# Altium footprint library ICs And Semiconductors THD.PcbLib: 507 footprints (part 5 of 32)
Each footprint in its own frame and in the unit in brackets; x right, y up, seen from the top. Pads: shape width x height; smd on the part's side, far side on the other; paste and mask are expansions set on the pad; w line width, h text height; cw(c..) or ccw(c..) is an arc to the next point about the centre after c.
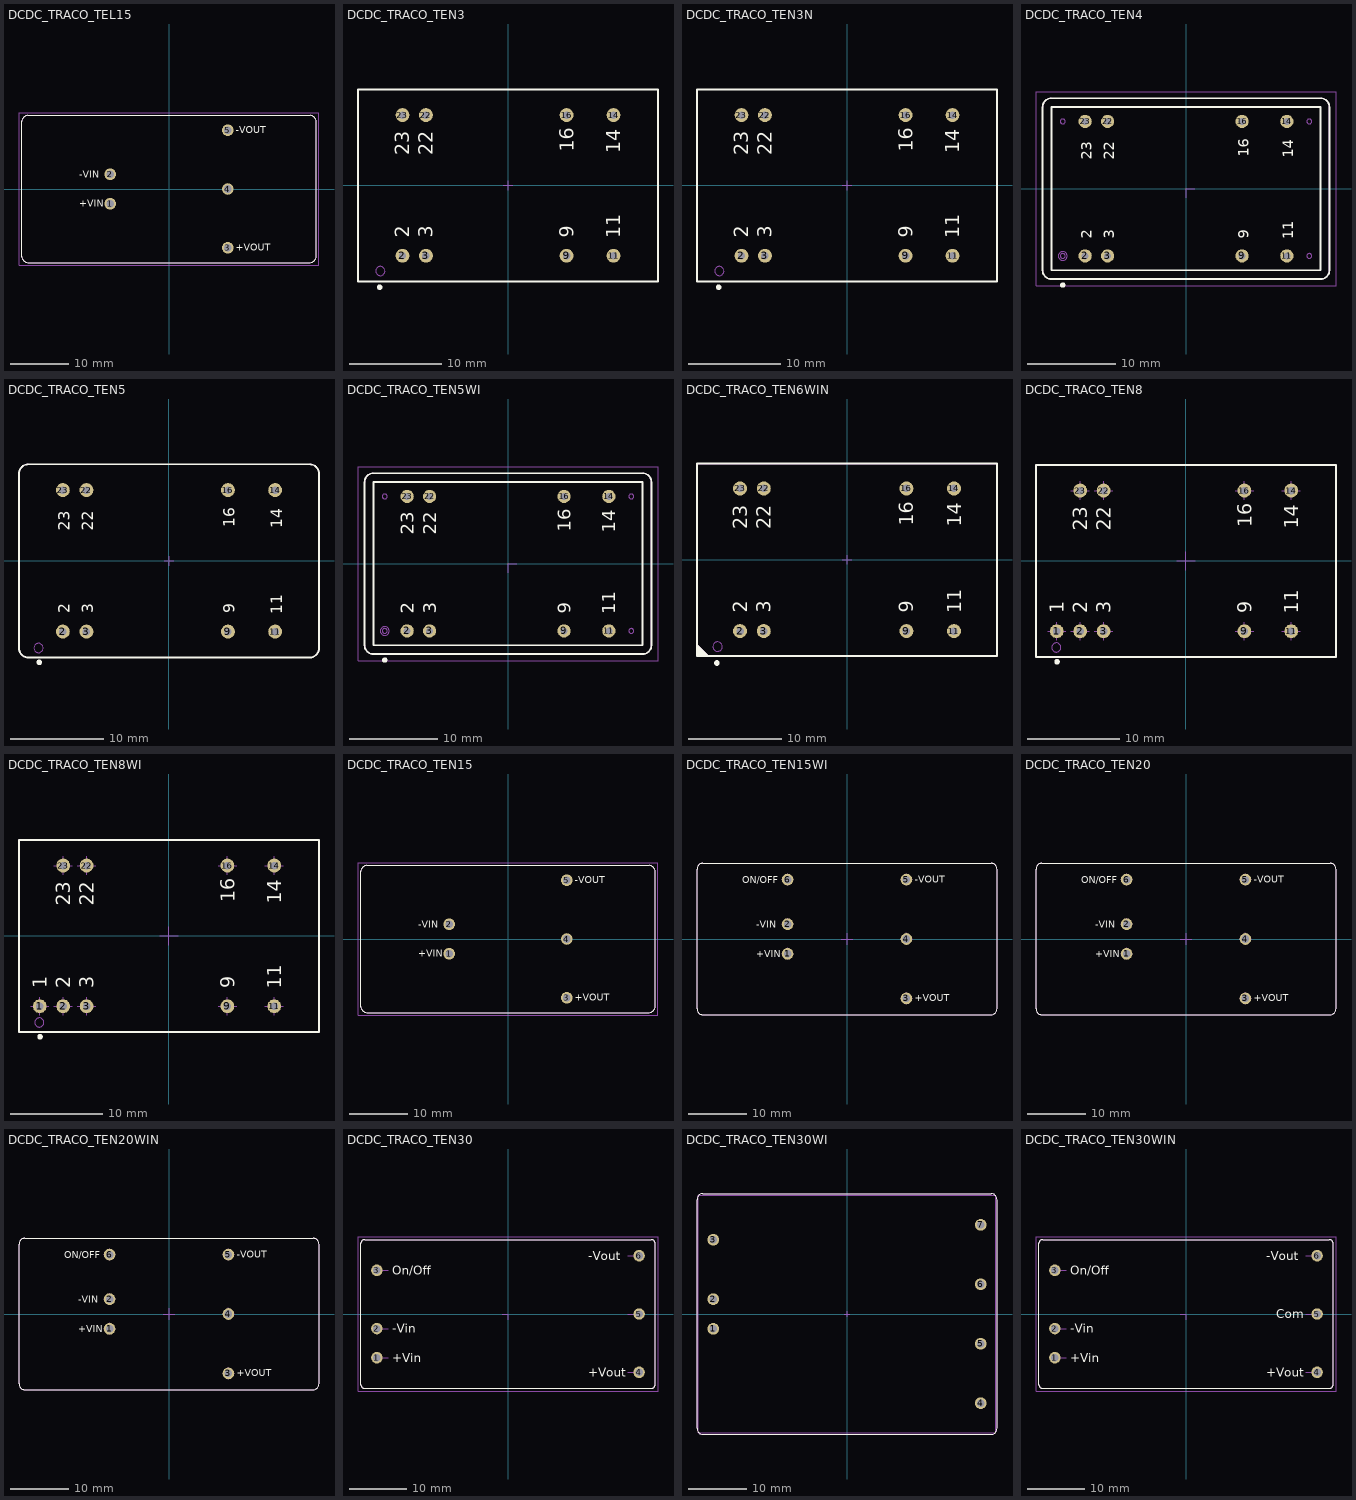
[diagram p4: the footprints below, top view; thin cyan lines are the x and y axes]

## DCDC_TRACO_TEL15 [mm] "TEL 15 Series , Body 50.8x25.4mm, Height 10.7mm"
height 10.7
pads (5):
  round 2 hole 1.3: 1(-10.16,-2.54) 2(-10.16,2.54) 3(10.16,-10.16) 4(10.16,0) 5(10.16,10.16)
Top Overlay:
  lines w0.2: -25.4,-11.7 ccw(c-24.4,-11.7) -24.4,-12.7 24.4,-12.7 ccw(c24.4,-11.7) 25.4,-11.7 25.4,11.7 ccw(c24.4,11.7) 24.4,12.7 -24.4,12.7 ccw(c-24.4,11.7) -25.4,11.7 -25.4,-11.7
  text "-VIN" at -15.5,1.9 h1.2
  text "-VOUT" at 11.56,9.645 h1.2
  text "+VOUT" at 11.56,-10.675 h1.2
  text "+VIN" at -15.5,-3.1 h1.2
Mechanical 14:
  lines w0.1: -25.4,-11.7 ccw(c-24.4,-11.7) -24.4,-12.7 24.4,-12.7 ccw(c24.4,-11.7) 25.4,-11.7 25.4,11.7 ccw(c24.4,11.7) 24.4,12.7 -24.4,12.7 ccw(c-24.4,11.7) -25.4,11.7 -25.4,-11.7
  text "+VOUT" at 11.56,-10.675 h1.2
  text "-VOUT" at 11.56,9.645 h1.2
  text "+VIN" at -15.5,-3.1 h1.2
  text "-VIN" at -15.5,1.9 h1.2
Mechanical 15:
  lines w0.05: -25.9,-13.2 25.9,-13.2 25.9,13.2 -25.9,13.2 -25.9,-13.2
3D body "DCDC_TRACO_TEL15.stp": height 10.2, standoff -3.8, extent -25.4,-12.7 25.4,12.7

## DCDC_TRACO_TEN3 [mm] "TEN 3 Series , Body 32x20.3mm"
height 10.7
pads (8):
  round 1.5 hole 0.8: 2(-11.43,-7.62) 3(-8.89,-7.62) 9(6.35,-7.62) 11(11.43,-7.62) 14(11.43,7.62) 16(6.35,7.62) 22(-8.89,7.62) 23(-11.43,7.62)
Top Overlay:
  circle w0.3: c-13.9,-11.025 r0.15
  lines w0.2: -16.25,-10.4 -16.25,10.4 16.25,10.4 16.25,-10.4 -16.25,-10.4
  text "16" at 7.1,3.632 h1.5
  text "14" at 12.18,3.505 h1.5
  text "22" at -8.14,3.251 h1.5
  text "23" at -10.68,3.251 h1.5
  text "9" at 7.1,-5.663 h1.5
  text "11" at 12.18,-5.737 h1.5
  text "3" at -8.14,-5.663 h1.5
  text "2" at -10.68,-5.663 h1.5
Notvisible:
  lines w0.1: -11.93,-7.62 -11.43,-7.62 ; -11.93,7.62 -11.43,7.62 ; -11.43,-8.12 -11.43,-7.62 ; -11.43,-7.12 -11.43,-7.62 ; -11.43,7.12 -11.43,7.62 ; -11.43,8.12 -11.43,7.62 ; -10.93,-7.62 -11.43,-7.62 ; -10.93,7.62 -11.43,7.62 ; -9.39,-7.62 -8.89,-7.62 ; -9.39,7.62 -8.89,7.62 ; -8.89,-8.12 -8.89,-7.62 ; -8.89,-7.12 -8.89,-7.62 ; -8.89,7.12 -8.89,7.62 ; -8.89,8.12 -8.89,7.62 ; -8.39,-7.62 -8.89,-7.62 ; -8.39,7.62 -8.89,7.62 ; -0.5,0 0,0 ; 0,-0.5 0,0 ; 0,0.5 0,0 ; 0.5,0 0,0 ; 5.85,-7.62 6.35,-7.62 ; 5.85,7.62 6.35,7.62 ; 6.35,-8.12 6.35,-7.62 ; 6.35,-7.12 6.35,-7.62 ; 6.35,7.12 6.35,7.62 ; 6.35,8.12 6.35,7.62 ; 6.85,-7.62 6.35,-7.62 ; 6.85,7.62 6.35,7.62 ; 10.93,-7.62 11.43,-7.62 ; 10.93,7.62 11.43,7.62 ; 11.43,-8.12 11.43,-7.62 ; 11.43,-7.12 11.43,-7.62 ; 11.43,7.12 11.43,7.62 ; 11.43,8.12 11.43,7.62 ; 11.93,-7.62 11.43,-7.62 ; 11.93,7.62 11.43,7.62
Mechanical 14:
  circle w0.1: c-13.825,-9.275 r0.5
  lines w0.1: -16.25,-10.4 -16.25,10.4 16.25,10.4 16.25,-10.4 -16.25,-10.4
  text "2" at -10.68,-5.663 h1.5
  text "3" at -8.14,-5.663 h1.5
  text "11" at 12.18,-5.737 h1.5
  text "9" at 7.1,-5.663 h1.5
  text "23" at -10.68,3.251 h1.5
  text "22" at -8.14,3.251 h1.5
  text "14" at 12.18,3.505 h1.5
  text "16" at 7.1,3.632 h1.5
3D body "DCDC_TRACO_TEN3.stp": height 12.7, standoff -3.8, extent -16.25,-10.4 16.25,10.4

## DCDC_TRACO_TEN3N [mm] "TEN 3N Series, Body 32.3x20.8mm"
height 10.7
pads (8):
  round 1.5 hole 0.8: 2(-11.43,-7.62) 3(-8.89,-7.62) 9(6.35,-7.62) 11(11.43,-7.62) 14(11.43,7.62) 16(6.35,7.62) 22(-8.89,7.62) 23(-11.43,7.62)
Top Overlay:
  circle w0.3: c-13.9,-11.025 r0.15
  lines w0.2: -16.25,-10.4 -16.25,10.4 16.25,10.4 16.25,-10.4 -16.25,-10.4
  text "16" at 7.1,3.632 h1.5
  text "14" at 12.18,3.505 h1.5
  text "22" at -8.14,3.251 h1.5
  text "23" at -10.68,3.251 h1.5
  text "9" at 7.1,-5.663 h1.5
  text "11" at 12.18,-5.737 h1.5
  text "3" at -8.14,-5.663 h1.5
  text "2" at -10.68,-5.663 h1.5
Notvisible:
  lines w0.1: -11.93,-7.62 -11.43,-7.62 ; -11.93,7.62 -11.43,7.62 ; -11.43,-8.12 -11.43,-7.62 ; -11.43,-7.12 -11.43,-7.62 ; -11.43,7.12 -11.43,7.62 ; -11.43,8.12 -11.43,7.62 ; -10.93,-7.62 -11.43,-7.62 ; -10.93,7.62 -11.43,7.62 ; -9.39,-7.62 -8.89,-7.62 ; -9.39,7.62 -8.89,7.62 ; -8.89,-8.12 -8.89,-7.62 ; -8.89,-7.12 -8.89,-7.62 ; -8.89,7.12 -8.89,7.62 ; -8.89,8.12 -8.89,7.62 ; -8.39,-7.62 -8.89,-7.62 ; -8.39,7.62 -8.89,7.62 ; -0.5,0 0,0 ; 0,-0.5 0,0 ; 0,0.5 0,0 ; 0.5,0 0,0 ; 5.85,-7.62 6.35,-7.62 ; 5.85,7.62 6.35,7.62 ; 6.35,-8.12 6.35,-7.62 ; 6.35,-7.12 6.35,-7.62 ; 6.35,7.12 6.35,7.62 ; 6.35,8.12 6.35,7.62 ; 6.85,-7.62 6.35,-7.62 ; 6.85,7.62 6.35,7.62 ; 10.93,-7.62 11.43,-7.62 ; 10.93,7.62 11.43,7.62 ; 11.43,-8.12 11.43,-7.62 ; 11.43,-7.12 11.43,-7.62 ; 11.43,7.12 11.43,7.62 ; 11.43,8.12 11.43,7.62 ; 11.93,-7.62 11.43,-7.62 ; 11.93,7.62 11.43,7.62
Mechanical 14:
  circle w0.1: c-13.825,-9.275 r0.5
  lines w0.1: -16.25,-10.4 -16.25,10.4 16.25,10.4 16.25,-10.4 -16.25,-10.4
  text "2" at -10.68,-5.663 h1.5
  text "3" at -8.14,-5.663 h1.5
  text "11" at 12.18,-5.737 h1.5
  text "9" at 7.1,-5.663 h1.5
  text "23" at -10.68,3.251 h1.5
  text "22" at -8.14,3.251 h1.5
  text "14" at 12.18,3.505 h1.5
  text "16" at 7.1,3.632 h1.5
3D body "DCDC_TRACO_TEN3N.stp": height 12.7, standoff -3.8, extent -16.25,-10.4 16.25,10.4

## DCDC_TRACO_TEN4 [mm] "TEN 4 Series , Body 32.5x20.8mm, DIP-24 Package with Standard Pinout"
height 10.5
pads (8):
  round 1.5 hole 0.8: 2(-11.43,-7.62) 3(-8.89,-7.62) 9(6.35,-7.62) 11(11.43,-7.62) 14(11.43,7.62) 16(6.35,7.62) 22(-8.89,7.62) 23(-11.43,7.62)
Top Overlay:
  circle w0.3: c-13.97,-10.922 r0.15
  lines w0.2: -16.25,-9.25 ccw(c-15.25,-9.25) -15.25,-10.25 15.25,-10.25 ccw(c15.25,-9.25) 16.25,-9.25 16.25,9.25 ccw(c15.25,9.25) 15.25,10.25 -15.25,10.25 ccw(c-15.25,9.25) -16.25,9.25 -16.25,-9.25 ; -15.25,-9.25 -15.25,9.25 15.25,9.25 15.25,-9.25 -15.25,-9.25
  text "2" at -10.68,-5.663 h1.2
  text "3" at -8.14,-5.663 h1.2
  text "11" at 12.18,-5.737 h1.2
  text "9" at 7.1,-5.663 h1.2
  text "23" at -10.68,3.251 h1.2
  text "22" at -8.14,3.251 h1.2
  text "14" at 12.18,3.505 h1.2
  text "16" at 7.1,3.632 h1.2
Notvisible:
  circle w0.1: c-13.97,-7.62 r0.275
  circle w0.1: c-13.97,7.62 r0.275
  circle w0.1: c13.97,-7.62 r0.275
  circle w0.1: c13.97,7.62 r0.275
  lines w0.1: 0,-1 0,0 1,0
Mechanical 14:
  circle w0.1: c-13.97,-7.63 r0.5
  lines w0.1: -16.25,-9.25 ccw(c-15.25,-9.25) -15.25,-10.25 15.25,-10.25 ccw(c15.25,-9.25) 16.25,-9.25 16.25,9.25 ccw(c15.25,9.25) 15.25,10.25 -15.25,10.25 ccw(c-15.25,9.25) -16.25,9.25 -16.25,-9.25
  text "16" at 7.1,3.632 h1.2
  text "14" at 12.18,3.505 h1.2
  text "22" at -8.14,3.251 h1.2
  text "23" at -10.68,3.251 h1.2
  text "9" at 7.1,-5.663 h1.2
  text "11" at 12.18,-5.737 h1.2
  text "3" at -8.14,-5.663 h1.2
  text "2" at -10.68,-5.663 h1.2
Mechanical 15:
  lines w0.05: -17,-11 17,-11 17,11 -17,11 -17,-11
3D body "DCDC_TRACO_TEN4.stp": height 10.5, standoff -3.8, extent -16.25,-10.25 16.05,10.4

## DCDC_TRACO_TEN5 [mm] "TEN 5 Series, Body 31.8x20.3mm"
height 10.7
pads (8):
  round 1.5 hole 0.8: 2(-11.43,-7.62) 3(-8.89,-7.62) 9(6.35,-7.62) 11(11.43,-7.62) 14(11.43,7.62) 16(6.35,7.62) 22(-8.89,7.62) 23(-11.43,7.62)
Top Overlay:
  circle w0.3: c-13.97,-10.922 r0.15
  lines w0.2: -16.15,-9.4 ccw(c-15.15,-9.4) -15.15,-10.4 15.15,-10.4 ccw(c15.15,-9.4) 16.15,-9.4 16.15,9.4 ccw(c15.15,9.4) 15.15,10.4 -15.15,10.4 ccw(c-15.15,9.4) -16.15,9.4 -16.15,-9.4
  text "2" at -10.68,-5.663 h1.2
  text "3" at -8.14,-5.663 h1.2
  text "11" at 12.18,-5.737 h1.2
  text "9" at 7.1,-5.663 h1.2
  text "23" at -10.68,3.251 h1.2
  text "22" at -8.14,3.251 h1.2
  text "14" at 12.18,3.505 h1.2
  text "16" at 7.1,3.632 h1.2
Notvisible:
  lines w0.1: -11.93,-7.62 -11.43,-7.62 ; -11.93,7.62 -11.43,7.62 ; -11.43,-8.12 -11.43,-7.62 ; -11.43,-7.12 -11.43,-7.62 ; -11.43,7.12 -11.43,7.62 ; -11.43,8.12 -11.43,7.62 ; -10.93,-7.62 -11.43,-7.62 ; -10.93,7.62 -11.43,7.62 ; -9.39,-7.62 -8.89,-7.62 ; -9.39,7.62 -8.89,7.62 ; -8.89,-8.12 -8.89,-7.62 ; -8.89,-7.12 -8.89,-7.62 ; -8.89,7.12 -8.89,7.62 ; -8.89,8.12 -8.89,7.62 ; -8.39,-7.62 -8.89,-7.62 ; -8.39,7.62 -8.89,7.62 ; -0.5,0 0,0 ; 0,-0.5 0,0 ; 0,0.5 0,0 ; 0.5,0 0,0 ; 5.85,-7.62 6.35,-7.62 ; 5.85,7.62 6.35,7.62 ; 6.35,-8.12 6.35,-7.62 ; 6.35,-7.12 6.35,-7.62 ; 6.35,7.12 6.35,7.62 ; 6.35,8.12 6.35,7.62 ; 6.85,-7.62 6.35,-7.62 ; 6.85,7.62 6.35,7.62 ; 10.93,-7.62 11.43,-7.62 ; 10.93,7.62 11.43,7.62 ; 11.43,-8.12 11.43,-7.62 ; 11.43,-7.12 11.43,-7.62 ; 11.43,7.12 11.43,7.62 ; 11.43,8.12 11.43,7.62 ; 11.93,-7.62 11.43,-7.62 ; 11.93,7.62 11.43,7.62
Mechanical 14:
  circle w0.1: c-14.045,-9.38 r0.5
  lines w0.1: -16.15,-9.4 ccw(c-15.15,-9.4) -15.15,-10.4 15.15,-10.4 ccw(c15.15,-9.4) 16.15,-9.4 16.15,9.4 ccw(c15.15,9.4) 15.15,10.4 -15.15,10.4 ccw(c-15.15,9.4) -16.15,9.4 -16.15,-9.4
  text "16" at 7.1,3.632 h1.2
  text "14" at 12.18,3.505 h1.2
  text "22" at -8.14,3.251 h1.2
  text "23" at -10.68,3.251 h1.2
  text "9" at 7.1,-5.663 h1.2
  text "11" at 12.18,-5.737 h1.2
  text "3" at -8.14,-5.663 h1.2
  text "2" at -10.68,-5.663 h1.2
3D body "DCDC_TRACO_TEN5.stp": height 10.7, standoff -3.2, extent -16.15,-10.4 16.15,10.4

## DCDC_TRACO_TEN5WI [mm] "TEN 5 Series , Body 32.5x20.5mm, DIP-24 Package with Standard Pinout"
height 10.5
pads (8):
  round 1.5 hole 0.8: 2(-11.43,-7.62) 3(-8.89,-7.62) 9(6.35,-7.62) 11(11.43,-7.62) 14(11.43,7.62) 16(6.35,7.62) 22(-8.89,7.62) 23(-11.43,7.62)
Top Overlay:
  circle w0.3: c-13.97,-10.922 r0.15
  lines w0.2: -16.25,-9.25 ccw(c-15.25,-9.25) -15.25,-10.25 15.25,-10.25 ccw(c15.25,-9.25) 16.25,-9.25 16.25,9.25 ccw(c15.25,9.25) 15.25,10.25 -15.25,10.25 ccw(c-15.25,9.25) -16.25,9.25 -16.25,-9.25 ; -15.25,-9.25 15.25,-9.25 15.25,9.25 -15.25,9.25 -15.25,-9.25
  text "16" at 7.1,3.632 h1.5
  text "14" at 12.18,3.505 h1.5
  text "22" at -8.14,3.251 h1.5
  text "23" at -10.68,3.251 h1.5
  text "9" at 7.1,-5.663 h1.5
  text "11" at 12.18,-5.737 h1.5
  text "3" at -8.14,-5.663 h1.5
  text "2" at -10.68,-5.663 h1.5
Notvisible:
  circle w0.1: c13.97,7.62 r0.275
  circle w0.1: c13.97,-7.62 r0.275
  circle w0.1: c-13.97,7.62 r0.275
  circle w0.1: c-13.97,-7.62 r0.275
  lines w0.1: 0,-1 0,0 1,0
Mechanical 14:
  circle w0.1: c-13.97,-7.63 r0.5
  lines w0.1: -16.25,-9.25 ccw(c-15.25,-9.25) -15.25,-10.25 15.25,-10.25 ccw(c15.25,-9.25) 16.25,-9.25 16.25,9.25 ccw(c15.25,9.25) 15.25,10.25 -15.25,10.25 ccw(c-15.25,9.25) -16.25,9.25 -16.25,-9.25
  text "2" at -10.68,-5.663 h1.5
  text "3" at -8.14,-5.663 h1.5
  text "11" at 12.18,-5.737 h1.5
  text "9" at 7.1,-5.663 h1.5
  text "23" at -10.68,3.251 h1.5
  text "22" at -8.14,3.251 h1.5
  text "14" at 12.18,3.505 h1.5
  text "16" at 7.1,3.632 h1.5
Mechanical 15:
  lines w0.05: -17,-11 -17,11 17,11 17,-11 -17,-11
3D body "DCDC_TRACO_TEN5WI.stp": height 10.5, standoff -3.8, extent -16.25,-10.25 16.25,10.25

## DCDC_TRACO_TEN6WIN [mm] "TEN 6WI Series , Body 31.8x20.3mm"
height 10.7
pads (8):
  round 1.5 hole 0.8: 2(-11.43,-7.62) 3(-8.89,-7.62) 9(6.35,-7.62) 11(11.43,-7.62) 14(11.43,7.62) 16(6.35,7.62) 22(-8.89,7.62) 23(-11.43,7.62)
Top Overlay:
  circle w0.3: c-13.9,-11.025 r0.15
  lines w0.1: -16.025,-9.216 -14.966,-10.275 ; -16.025,-9.075 -14.825,-10.275
  lines w0.2: -16.025,-10.206 -15.956,-10.275 ; -16.025,-10.065 -15.815,-10.275 ; -16.025,-9.924 -15.674,-10.275 ; -16.025,-9.782 -15.532,-10.275 ; -16.025,-9.641 -15.391,-10.275 ; -16.025,-9.499 -15.249,-10.275 ; -16.025,-9.358 -15.108,-10.275 ; -16.025,-9.075 -16.025,-10.275 ; -14.825,-10.275 -16.025,-10.275 ; -16.025,-10.275 16.025,-10.275 16.025,10.275 -16.025,10.275 -16.025,-10.275
  text "2" at -10.68,-5.663 h1.5
  text "3" at -8.14,-5.663 h1.5
  text "11" at 12.18,-5.737 h1.5
  text "9" at 7.1,-5.663 h1.5
  text "23" at -10.68,3.251 h1.5
  text "22" at -8.14,3.251 h1.5
  text "14" at 12.18,3.505 h1.5
  text "16" at 7.1,3.632 h1.5
Notvisible:
  lines w0.1: -11.93,-7.62 -11.43,-7.62 ; -11.93,7.62 -11.43,7.62 ; -11.43,-8.12 -11.43,-7.62 ; -11.43,-7.12 -11.43,-7.62 ; -11.43,7.12 -11.43,7.62 ; -11.43,8.12 -11.43,7.62 ; -10.93,-7.62 -11.43,-7.62 ; -10.93,7.62 -11.43,7.62 ; -9.39,-7.62 -8.89,-7.62 ; -9.39,7.62 -8.89,7.62 ; -8.89,-8.12 -8.89,-7.62 ; -8.89,-7.12 -8.89,-7.62 ; -8.89,7.12 -8.89,7.62 ; -8.89,8.12 -8.89,7.62 ; -8.39,-7.62 -8.89,-7.62 ; -8.39,7.62 -8.89,7.62 ; -0.5,0 0,0 ; 0,-0.5 0,0 ; 0,0.5 0,0 ; 0.5,0 0,0 ; 5.85,-7.62 6.35,-7.62 ; 5.85,7.62 6.35,7.62 ; 6.35,-8.12 6.35,-7.62 ; 6.35,-7.12 6.35,-7.62 ; 6.35,7.12 6.35,7.62 ; 6.35,8.12 6.35,7.62 ; 6.85,-7.62 6.35,-7.62 ; 6.85,7.62 6.35,7.62 ; 10.93,-7.62 11.43,-7.62 ; 10.93,7.62 11.43,7.62 ; 11.43,-8.12 11.43,-7.62 ; 11.43,-7.12 11.43,-7.62 ; 11.43,7.12 11.43,7.62 ; 11.43,8.12 11.43,7.62 ; 11.93,-7.62 11.43,-7.62 ; 11.93,7.62 11.43,7.62
Mechanical 14:
  circle w0.1: c-13.825,-9.275 r0.5
  lines w0.1: -16.025,-10.206 -15.956,-10.275 ; -16.025,-10.065 -15.815,-10.275 ; -16.025,-9.924 -15.674,-10.275 ; -16.025,-9.782 -15.532,-10.275 ; -16.025,-9.641 -15.391,-10.275 ; -16.025,-9.499 -15.249,-10.275 ; -16.025,-9.358 -15.108,-10.275 ; -16.025,-9.216 -14.966,-10.275 ; -16.025,-9.075 -14.825,-10.275 ; -16.025,-10.275 16.025,-10.275 16.025,10.275 -16.025,10.275 -16.025,-10.275
  text "16" at 7.1,3.632 h1.5
  text "14" at 12.18,3.505 h1.5
  text "22" at -8.14,3.251 h1.5
  text "23" at -10.68,3.251 h1.5
  text "9" at 7.1,-5.663 h1.5
  text "11" at 12.18,-5.737 h1.5
  text "3" at -8.14,-5.663 h1.5
  text "2" at -10.68,-5.663 h1.5
3D body "DCDC_TRACO_TEN6WIN.stp": height 10.7, standoff -3.8, extent -16.025,-10.275 16.025,10.275

## DCDC_TRACO_TEN8 [mm] "TEN 8 Series, Body 32x20.3mm"
height 10.7
pads (9):
  round 1.5 hole 0.8: 1(-14,-7.62) 2(-11.46,-7.62) 3(-8.92,-7.62) 9(6.32,-7.62) 11(11.4,-7.62) 14(11.4,7.62) 16(6.32,7.62) 22(-8.92,7.62) 23(-11.46,7.62)
Top Overlay:
  circle w0.3: c-13.97,-10.922 r0.15
  lines w0.2: -16.25,-10.4 16.25,-10.4 16.25,10.4 -16.25,10.4 -16.25,-10.4
  text "1" at -13.22,-5.663 h1.5
  text "2" at -10.68,-5.663 h1.5
  text "3" at -8.14,-5.663 h1.5
  text "11" at 12.18,-5.737 h1.5
  text "9" at 7.1,-5.663 h1.5
  text "23" at -10.68,3.251 h1.5
  text "22" at -8.14,3.251 h1.5
  text "14" at 12.18,3.505 h1.5
  text "16" at 7.1,3.632 h1.5
Notvisible:
  lines w0.1: -15,-7.62 -14,-7.62 ; -14,-8.62 -14,-7.62 ; -14,-6.62 -14,-7.62 ; -13,-7.62 -14,-7.62 ; -12.46,-7.62 -11.46,-7.62 ; -12.46,7.62 -11.46,7.62 ; -11.46,-8.62 -11.46,-7.62 ; -11.46,-6.62 -11.46,-7.62 ; -11.46,6.62 -11.46,7.62 ; -11.46,8.62 -11.46,7.62 ; -10.46,-7.62 -11.46,-7.62 ; -10.46,7.62 -11.46,7.62 ; -9.92,-7.62 -8.92,-7.62 ; -9.92,7.62 -8.92,7.62 ; -8.92,-8.62 -8.92,-7.62 ; -8.92,-6.62 -8.92,-7.62 ; -8.92,6.62 -8.92,7.62 ; -8.92,8.62 -8.92,7.62 ; -7.92,-7.62 -8.92,-7.62 ; -7.92,7.62 -8.92,7.62 ; -1,0 0,0 ; 0,-1 0,0 ; 0,1 0,0 ; 1,0 0,0 ; 5.32,-7.62 6.32,-7.62 ; 5.32,7.62 6.32,7.62 ; 6.32,-8.62 6.32,-7.62 ; 6.32,-6.62 6.32,-7.62 ; 6.32,6.62 6.32,7.62 ; 6.32,8.62 6.32,7.62 ; 7.32,-7.62 6.32,-7.62 ; 7.32,7.62 6.32,7.62 ; 10.4,-7.62 11.4,-7.62 ; 10.4,7.62 11.4,7.62 ; 11.4,-8.62 11.4,-7.62 ; 11.4,-6.62 11.4,-7.62 ; 11.4,6.62 11.4,7.62 ; 11.4,8.62 11.4,7.62 ; 12.4,-7.62 11.4,-7.62 ; 12.4,7.62 11.4,7.62
Mechanical 14:
  circle w0.1: c-14.045,-9.38 r0.5
  lines w0.1: -16.25,-10.4 16.25,-10.4 16.25,10.4 -16.25,10.4 -16.25,-10.4
  text "1" at -13.22,-5.663 h1.5
  text "16" at 7.1,3.632 h1.5
  text "14" at 12.18,3.505 h1.5
  text "22" at -8.14,3.251 h1.5
  text "23" at -10.68,3.251 h1.5
  text "9" at 7.1,-5.663 h1.5
  text "11" at 12.18,-5.737 h1.5
  text "3" at -8.14,-5.663 h1.5
  text "2" at -10.68,-5.663 h1.5
3D body "DCDC_TRACO_TEN8.stp": height 10.7, standoff -3.8, extent -16.25,-10.4 16.25,10.4

## DCDC_TRACO_TEN8WI [mm] "TEN 8 WI Series, Body 32x20.3mm"
height 10.7
pads (9):
  round 1.5 hole 0.8: 1(-14,-7.62) 2(-11.46,-7.62) 3(-8.92,-7.62) 9(6.32,-7.62) 11(11.4,-7.62) 14(11.4,7.62) 16(6.32,7.62) 22(-8.92,7.62) 23(-11.46,7.62)
Top Overlay:
  circle w0.3: c-13.97,-10.922 r0.15
  lines w0.2: -16.25,-10.4 -16.25,10.4 16.25,10.4 16.25,-10.4 -16.25,-10.4
  text "16" at 7.1,3.632 h1.5
  text "14" at 12.18,3.505 h1.5
  text "22" at -8.14,3.251 h1.5
  text "23" at -10.68,3.251 h1.5
  text "9" at 7.1,-5.663 h1.5
  text "11" at 12.18,-5.737 h1.5
  text "3" at -8.14,-5.663 h1.5
  text "2" at -10.68,-5.663 h1.5
  text "1" at -13.22,-5.663 h1.5
Notvisible:
  lines w0.1: -15,-7.62 -14,-7.62 ; -14,-8.62 -14,-7.62 ; -14,-6.62 -14,-7.62 ; -13,-7.62 -14,-7.62 ; -12.46,-7.62 -11.46,-7.62 ; -12.46,7.62 -11.46,7.62 ; -11.46,-8.62 -11.46,-7.62 ; -11.46,-6.62 -11.46,-7.62 ; -11.46,6.62 -11.46,7.62 ; -11.46,8.62 -11.46,7.62 ; -10.46,-7.62 -11.46,-7.62 ; -10.46,7.62 -11.46,7.62 ; -9.92,-7.62 -8.92,-7.62 ; -9.92,7.62 -8.92,7.62 ; -8.92,-8.62 -8.92,-7.62 ; -8.92,-6.62 -8.92,-7.62 ; -8.92,6.62 -8.92,7.62 ; -8.92,8.62 -8.92,7.62 ; -7.92,-7.62 -8.92,-7.62 ; -7.92,7.62 -8.92,7.62 ; -1,0 0,0 ; 0,-1 0,0 ; 0,1 0,0 ; 1,0 0,0 ; 5.32,-7.62 6.32,-7.62 ; 5.32,7.62 6.32,7.62 ; 6.32,-8.62 6.32,-7.62 ; 6.32,-6.62 6.32,-7.62 ; 6.32,6.62 6.32,7.62 ; 6.32,8.62 6.32,7.62 ; 7.32,-7.62 6.32,-7.62 ; 7.32,7.62 6.32,7.62 ; 10.4,-7.62 11.4,-7.62 ; 10.4,7.62 11.4,7.62 ; 11.4,-8.62 11.4,-7.62 ; 11.4,-6.62 11.4,-7.62 ; 11.4,6.62 11.4,7.62 ; 11.4,8.62 11.4,7.62 ; 12.4,-7.62 11.4,-7.62 ; 12.4,7.62 11.4,7.62
Mechanical 14:
  circle w0.1: c-14.045,-9.38 r0.5
  lines w0.1: -16.25,-10.4 -16.25,10.4 16.25,10.4 16.25,-10.4 -16.25,-10.4
  text "2" at -10.68,-5.663 h1.5
  text "3" at -8.14,-5.663 h1.5
  text "11" at 12.18,-5.737 h1.5
  text "9" at 7.1,-5.663 h1.5
  text "23" at -10.68,3.251 h1.5
  text "22" at -8.14,3.251 h1.5
  text "14" at 12.18,3.505 h1.5
  text "16" at 7.1,3.632 h1.5
  text "1" at -13.22,-5.663 h1.5
3D body "DCDC_TRACO_TEN8WI.stp": height 10.7, standoff -3.8, extent -16.25,-10.4 16.25,10.4

## DCDC_TRACO_TEN15 [mm] "TEN 15 Series , Body 50.8x25.4mm, Height 10.7mm"
height 10.7
pads (5):
  round 2 hole 1.3: 1(-10.16,-2.54) 2(-10.16,2.54) 3(10.16,-10.16) 4(10.16,0) 5(10.16,10.16)
Top Overlay:
  lines w0.2: -25.4,-11.7 ccw(c-24.4,-11.7) -24.4,-12.7 24.4,-12.7 ccw(c24.4,-11.7) 25.4,-11.7 25.4,11.7 ccw(c24.4,11.7) 24.4,12.7 -24.4,12.7 ccw(c-24.4,11.7) -25.4,11.7 -25.4,-11.7
  text "-VIN" at -15.5,1.9 h1.2
  text "-VOUT" at 11.56,9.645 h1.2
  text "+VOUT" at 11.56,-10.675 h1.2
  text "+VIN" at -15.5,-3.1 h1.2
Mechanical 14:
  lines w0.1: -25.4,-11.7 ccw(c-24.4,-11.7) -24.4,-12.7 24.4,-12.7 ccw(c24.4,-11.7) 25.4,-11.7 25.4,11.7 ccw(c24.4,11.7) 24.4,12.7 -24.4,12.7 ccw(c-24.4,11.7) -25.4,11.7 -25.4,-11.7
  text "+VOUT" at 11.56,-10.675 h1.2
  text "-VOUT" at 11.56,9.645 h1.2
  text "+VIN" at -15.5,-3.1 h1.2
  text "-VIN" at -15.5,1.9 h1.2
Mechanical 15:
  lines w0.05: -25.9,-13.2 25.9,-13.2 25.9,13.2 -25.9,13.2 -25.9,-13.2
3D body "DCDC_TRACO_TEN15.stp": height 10.2, standoff -3.8, extent -25.4,-12.7 25.4,12.7

## DCDC_TRACO_TEN15WI [mm] "TEN 15WI Series , Body 50.8x25.4mm, Height 10.2mm"
height 10.2
pads (6):
  round 2 hole 1.3: 1(-10.16,-2.54) 2(-10.16,2.54) 3(10.16,-10.16) 4(10.16,0) 5(10.16,10.16) 6(-10.16,10.16)
Top Overlay:
  lines w0.2: -25.65,-11.95 ccw(c-24.65,-11.95) -24.65,-12.95 24.65,-12.95 ccw(c24.65,-11.95) 25.65,-11.95 25.65,11.95 ccw(c24.65,11.95) 24.65,12.95 -24.65,12.95 ccw(c-24.65,11.95) -25.65,11.95 -25.65,-11.95
  text "-VIN" at -15.5,1.9 h1.2
  text "-VOUT" at 11.56,9.645 h1.2
  text "+VOUT" at 11.56,-10.675 h1.2
  text "+VIN" at -15.5,-3.1 h1.2
  text "ON/OFF" at -17.9,9.52 h1.2
Notvisible:
  lines w0.1: -11.16,-2.5 -10.16,-2.5 ; -11.16,2.58 -10.16,2.58 ; -11.16,10.2 -10.16,10.2 ; -10.16,-3.5 -10.16,-2.5 ; -10.16,-1.5 -10.16,-2.5 ; -10.16,1.58 -10.16,2.58 ; -10.16,3.58 -10.16,2.58 ; -10.16,9.2 -10.16,10.2 ; -10.16,11.2 -10.16,10.2 ; -9.16,-2.5 -10.16,-2.5 ; -9.16,2.58 -10.16,2.58 ; -9.16,10.2 -10.16,10.2 ; -1,0 0,0 ; 0,-1 0,0 ; 0,1 0,0 ; 1,0 0,0 ; 9.16,-10.12 10.16,-10.12 ; 9.16,0.04 10.16,0.04 ; 9.16,10.2 10.16,10.2 ; 10.16,-11.12 10.16,-10.12 ; 10.16,-9.12 10.16,-10.12 ; 10.16,-0.96 10.16,0.04 ; 10.16,1.04 10.16,0.04 ; 10.16,9.2 10.16,10.2 ; 10.16,11.2 10.16,10.2 ; 11.16,-10.12 10.16,-10.12 ; 11.16,0.04 10.16,0.04 ; 11.16,10.2 10.16,10.2
Mechanical 14:
  lines w0.1: -25.65,-11.95 ccw(c-24.65,-11.95) -24.65,-12.95 24.65,-12.95 ccw(c24.65,-11.95) 25.65,-11.95 25.65,11.95 ccw(c24.65,11.95) 24.65,12.95 -24.65,12.95 ccw(c-24.65,11.95) -25.65,11.95 -25.65,-11.95
  text "+VOUT" at 11.56,-10.675 h1.2
  text "-VOUT" at 11.56,9.645 h1.2
  text "+VIN" at -15.5,-3.1 h1.2
  text "-VIN" at -15.5,1.9 h1.2
  text "ON/OFF" at -17.9,9.52 h1.2
3D body "DCDC_TRACO_TEN15WI.stp": height 10.7, standoff -3.8, extent -25.65,-12.95 25.65,12.95

## DCDC_TRACO_TEN20 [mm] "TEN 20 Series , Body 50.8x25.4mm, Height 10.2mm"
height 10.7
pads (6):
  round 2 hole 1.3: 1(-10.16,-2.54) 2(-10.16,2.54) 3(10.16,-10.16) 4(10.16,0) 5(10.16,10.16) 6(-10.16,10.16)
Top Overlay:
  lines w0.2: -25.65,-11.95 ccw(c-24.65,-11.95) -24.65,-12.95 24.65,-12.95 ccw(c24.65,-11.95) 25.65,-11.95 25.65,11.95 ccw(c24.65,11.95) 24.65,12.95 -24.65,12.95 ccw(c-24.65,11.95) -25.65,11.95 -25.65,-11.95
  text "-VIN" at -15.5,1.9 h1.2
  text "-VOUT" at 11.56,9.645 h1.2
  text "+VOUT" at 11.56,-10.675 h1.2
  text "+VIN" at -15.5,-3.1 h1.2
  text "ON/OFF" at -17.9,9.52 h1.2
Notvisible:
  lines w0.1: -11.16,-2.5 -10.16,-2.5 ; -11.16,2.58 -10.16,2.58 ; -11.16,10.2 -10.16,10.2 ; -10.16,-3.5 -10.16,-2.5 ; -10.16,-1.5 -10.16,-2.5 ; -10.16,1.58 -10.16,2.58 ; -10.16,3.58 -10.16,2.58 ; -10.16,9.2 -10.16,10.2 ; -10.16,11.2 -10.16,10.2 ; -9.16,-2.5 -10.16,-2.5 ; -9.16,2.58 -10.16,2.58 ; -9.16,10.2 -10.16,10.2 ; -1,0 0,0 ; 0,-1 0,0 ; 0,1 0,0 ; 1,0 0,0 ; 9.16,-10.12 10.16,-10.12 ; 9.16,0.04 10.16,0.04 ; 9.16,10.2 10.16,10.2 ; 10.16,-11.12 10.16,-10.12 ; 10.16,-9.12 10.16,-10.12 ; 10.16,-0.96 10.16,0.04 ; 10.16,1.04 10.16,0.04 ; 10.16,9.2 10.16,10.2 ; 10.16,11.2 10.16,10.2 ; 11.16,-10.12 10.16,-10.12 ; 11.16,0.04 10.16,0.04 ; 11.16,10.2 10.16,10.2
Mechanical 14:
  lines w0.1: -25.65,-11.95 ccw(c-24.65,-11.95) -24.65,-12.95 24.65,-12.95 ccw(c24.65,-11.95) 25.65,-11.95 25.65,11.95 ccw(c24.65,11.95) 24.65,12.95 -24.65,12.95 ccw(c-24.65,11.95) -25.65,11.95 -25.65,-11.95
  text "+VOUT" at 11.56,-10.675 h1.2
  text "-VOUT" at 11.56,9.645 h1.2
  text "+VIN" at -15.5,-3.1 h1.2
  text "-VIN" at -15.5,1.9 h1.2
  text "ON/OFF" at -17.9,9.52 h1.2
3D body "DCDC_TRACO_TEN20.stp": height 10.7, standoff -3.8, extent -25.65,-12.95 25.65,12.95

## DCDC_TRACO_TEN20WIN [mm] "TEN 20WIN Series , Body 50.8x25.4mm, Height 10.2mm"
height 10.7
pads (6):
  round 2 hole 1.3: 1(-10.16,-2.54) 2(-10.16,2.54) 3(10.16,-10.16) 4(10.16,0) 5(10.16,10.16) 6(-10.16,10.16)
Top Overlay:
  lines w0.2: -25.65,-11.95 ccw(c-24.65,-11.95) -24.65,-12.95 24.65,-12.95 ccw(c24.65,-11.95) 25.65,-11.95 25.65,11.95 ccw(c24.65,11.95) 24.65,12.95 -24.65,12.95 ccw(c-24.65,11.95) -25.65,11.95 -25.65,-11.95
  text "ON/OFF" at -17.9,9.52 h1.2
  text "+VIN" at -15.5,-3.1 h1.2
  text "+VOUT" at 11.56,-10.675 h1.2
  text "-VOUT" at 11.56,9.645 h1.2
  text "-VIN" at -15.5,1.9 h1.2
Notvisible:
  lines w0.1: -11.16,-2.5 -10.16,-2.5 ; -11.16,2.58 -10.16,2.58 ; -11.16,10.2 -10.16,10.2 ; -10.16,-3.5 -10.16,-2.5 ; -10.16,-1.5 -10.16,-2.5 ; -10.16,1.58 -10.16,2.58 ; -10.16,3.58 -10.16,2.58 ; -10.16,9.2 -10.16,10.2 ; -10.16,11.2 -10.16,10.2 ; -9.16,-2.5 -10.16,-2.5 ; -9.16,2.58 -10.16,2.58 ; -9.16,10.2 -10.16,10.2 ; -1,0 0,0 ; 0,-1 0,0 ; 0,1 0,0 ; 1,0 0,0 ; 9.16,-10.12 10.16,-10.12 ; 9.16,0.04 10.16,0.04 ; 9.16,10.2 10.16,10.2 ; 10.16,-11.12 10.16,-10.12 ; 10.16,-9.12 10.16,-10.12 ; 10.16,-0.96 10.16,0.04 ; 10.16,1.04 10.16,0.04 ; 10.16,9.2 10.16,10.2 ; 10.16,11.2 10.16,10.2 ; 11.16,-10.12 10.16,-10.12 ; 11.16,0.04 10.16,0.04 ; 11.16,10.2 10.16,10.2
Mechanical 14:
  lines w0.1: -25.65,-11.95 ccw(c-24.65,-11.95) -24.65,-12.95 24.65,-12.95 ccw(c24.65,-11.95) 25.65,-11.95 25.65,11.95 ccw(c24.65,11.95) 24.65,12.95 -24.65,12.95 ccw(c-24.65,11.95) -25.65,11.95 -25.65,-11.95
  text "ON/OFF" at -17.9,9.52 h1.2
  text "-VIN" at -15.5,1.9 h1.2
  text "+VIN" at -15.5,-3.1 h1.2
  text "-VOUT" at 11.56,9.645 h1.2
  text "+VOUT" at 11.56,-10.675 h1.2
3D body "DCDC_TRACO_TEN20WIN.stp": height 10.7, standoff -3.8, extent -25.65,-12.95 25.65,12.95

## DCDC_TRACO_TEN30 [mm] "TEN 30 Series , Body 51.3x25.9mm"
height 10.7
pads (6):
  round 2 hole 1.3: 1(-22.86,-7.62) 2(-22.86,-2.54) 3(-22.86,7.62) 4(22.86,-10.16) 5(22.86,0) 6(22.86,10.16)
Top Overlay:
  lines w0.2: -25.65,-12.315 ccw(c-25.015,-12.315) -25.015,-12.95 25.015,-12.95 ccw(c25.015,-12.315) 25.65,-12.315 25.65,12.315 ccw(c25.015,12.315) 25.015,12.95 -25.015,12.95 ccw(c-25.015,12.315) -25.65,12.315 -25.65,-12.315
  text "+Vin" at -20.193,-8.37 h1.5
  text "-Vin" at -20.193,-3.29 h1.5
  text "On/Off" at -20.193,6.87 h1.5
  text "+Vout" at 13.999,-10.91 h1.5
  text "-Vout" at 13.999,9.41 h1.5
Notvisible:
  lines w0.1: -22.86,-7.62 -20.86,-7.62 ; -22.86,-2.54 -20.86,-2.54 ; -22.86,7.62 -20.86,7.62 ; -1,0 0,0 0,-1 ; 20.86,-10.16 22.86,-10.16 ; 20.86,0 22.86,0 ; 20.86,10.16 22.86,10.16
Mechanical 14:
  lines w0.1: -25.65,-12.315 ccw(c-25.015,-12.315) -25.015,-12.95 25.015,-12.95 ccw(c25.015,-12.315) 25.65,-12.315 25.65,12.315 ccw(c25.015,12.315) 25.015,12.95 -25.015,12.95 ccw(c-25.015,12.315) -25.65,12.315 -25.65,-12.315
Mechanical 15:
  lines w0.05: -26.15,-13.45 -26.15,13.45 26.15,13.45 26.15,-13.45 -26.15,-13.45
3D body "DCDC_TRACO_TEN30.stp": height 10.7, standoff -3.8, extent -25.4,-12.7 25.4,12.7

## DCDC_TRACO_TEN30WI [mm] "TEN 30WI Series , Body 50.8x40.6mm"
height 10.7
pads (7):
  round 2 hole 1.3: 1(-22.86,-2.54) 2(-22.86,2.54) 3(-22.86,12.7) 4(22.86,-15.24) 5(22.86,-5.08) 6(22.86,5.08) 7(22.86,15.24)
Top Overlay:
  lines w0.2: -25.65,-19.57 ccw(c-24.65,-19.57) -24.65,-20.57 24.65,-20.57 ccw(c24.65,-19.57) 25.65,-19.57 25.65,19.57 ccw(c24.65,19.57) 24.65,20.57 -24.65,20.57 ccw(c-24.65,19.57) -25.65,19.57 -25.65,-19.57
Notvisible:
  lines w0.1: -23.36,-2.54 -22.86,-2.54 ; -23.36,2.54 -22.86,2.54 ; -23.36,12.7 -22.86,12.7 ; -22.86,-3.04 -22.86,-2.54 ; -22.86,-2.04 -22.86,-2.54 ; -22.86,2.04 -22.86,2.54 ; -22.86,3.04 -22.86,2.54 ; -22.86,12.2 -22.86,12.7 ; -22.86,13.2 -22.86,12.7 ; -22.36,-2.54 -22.86,-2.54 ; -22.36,2.54 -22.86,2.54 ; -22.36,12.7 -22.86,12.7 ; -0.5,0 0,0 ; 0,-0.5 0,0 ; 0,0.5 0,0 ; 0.5,0 0,0 ; 22.36,-15.24 22.86,-15.24 ; 22.36,-5.08 22.86,-5.08 ; 22.36,5.08 22.86,5.08 ; 22.36,15.24 22.86,15.24 ; 22.86,-15.74 22.86,-15.24 ; 22.86,-14.74 22.86,-15.24 ; 22.86,-5.58 22.86,-5.08 ; 22.86,-4.58 22.86,-5.08 ; 22.86,4.58 22.86,5.08 ; 22.86,5.58 22.86,5.08 ; 22.86,14.74 22.86,15.24 ; 22.86,15.74 22.86,15.24 ; 23.36,-15.24 22.86,-15.24 ; 23.36,-5.08 22.86,-5.08 ; 23.36,5.08 22.86,5.08 ; 23.36,15.24 22.86,15.24 ; -25.4,-20.32 25.4,-20.32 25.4,20.32 -25.4,20.32 -25.4,-20.32
Mechanical 14:
  lines w0.1: -25.65,-19.57 ccw(c-24.65,-19.57) -24.65,-20.57 24.65,-20.57 ccw(c24.65,-19.57) 25.65,-19.57 25.65,19.57 ccw(c24.65,19.57) 24.65,20.57 -24.65,20.57 ccw(c-24.65,19.57) -25.65,19.57 -25.65,-19.57
3D body "DCDC_TRACO_TEN30WI.stp": height 10.7, standoff -3.8, extent -25.65,-20.57 25.65,20.57

## DCDC_TRACO_TEN30WIN [mm] "TEN 30WIN Series , Body 51.3x25.9mm"
height 10.7
pads (6):
  round 2 hole 1.3: 1(-22.86,-7.62) 2(-22.86,-2.54) 3(-22.86,7.62) 4(22.86,-10.16) 5(22.86,0) 6(22.86,10.16)
Top Overlay:
  lines w0.2: -25.65,-12.315 ccw(c-25.015,-12.315) -25.015,-12.95 25.015,-12.95 ccw(c25.015,-12.315) 25.65,-12.315 25.65,12.315 ccw(c25.015,12.315) 25.015,12.95 -25.015,12.95 ccw(c-25.015,12.315) -25.65,12.315 -25.65,-12.315
  text "+Vin" at -20.193,-8.37 h1.5
  text "-Vin" at -20.193,-3.29 h1.5
  text "On/Off" at -20.193,6.87 h1.5
  text "-Vout" at 13.999,9.41 h1.5
  text "Com" at 15.769,-0.75 h1.5
  text "+Vout" at 13.999,-10.91 h1.5
Notvisible:
  circle w0.1: c-22.86,7.62 r0.5
  circle w0.1: c-22.86,-2.54 r0.5
  circle w0.1: c-22.86,-7.62 r0.5
  circle w0.1: c22.86,-10.16 r0.5
  circle w0.1: c22.86,0 r0.5
  circle w0.1: c22.86,10.16 r0.5
  lines w0.1: -22.86,-7.62 -20.86,-7.62 ; -22.86,-2.54 -20.86,-2.54 ; -22.86,7.62 -20.86,7.62 ; -1,0 0,0 0,-1 ; 20.86,-10.16 22.86,-10.16 ; 20.86,0 22.86,0 ; 20.86,10.16 22.86,10.16
Mechanical 14:
  lines w0.1: -25.65,-12.315 ccw(c-25.015,-12.315) -25.015,-12.95 25.015,-12.95 ccw(c25.015,-12.315) 25.65,-12.315 25.65,12.315 ccw(c25.015,12.315) 25.015,12.95 -25.015,12.95 ccw(c-25.015,12.315) -25.65,12.315 -25.65,-12.315
Mechanical 15:
  lines w0.05: -26.15,-13.45 -26.15,13.45 26.15,13.45 26.15,-13.45 -26.15,-13.45
3D body "DCDC_TRACO_TEN30WIN.stp": height 10.7, standoff -3.8, extent -25.4,-12.7 25.4,12.7